# Altium integrated library WCAP-FTX2_rev15a.intlib: 100 symbols
Pins are listed as number, name and electrical type; pins without a type are passive.

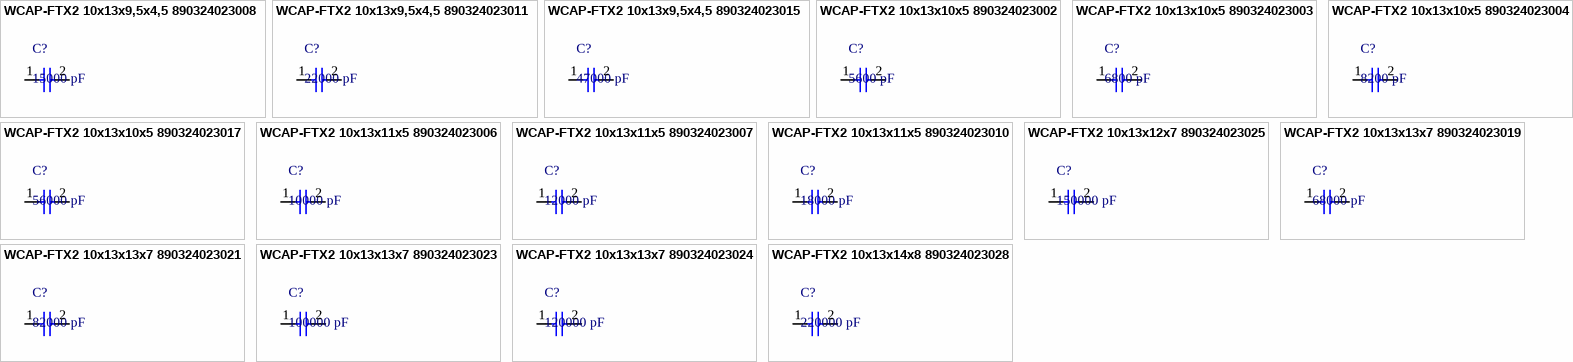
[diagram p0: symbols WCAP-FTX2 10x13x9,5x4,5 890324023008 to WCAP-FTX2 10x13x14x8 890324023028]

## WCAP-FTX2 10x13x9,5x4,5 890324023008
designator C?, comment 15000 pF
WCAP-FTX2 Film Capacitors, C=15000 pF; Manufacturer: Wurth Elektronik; partNo: 890324023008; E-mail: libraries@we-online.com; ComponentLink1Description: Manufacturer; ComponentLink1URL: http://www.we-online.com; ComponentLink2Description: Datasheet; ComponentLink2URL: http://katalog.we-online.de/pbs/datasheet/890324023008.pdf; Created by: Karrer Zheng; Created Date: 1/21/2015; Capacitance: 15000 pF
footprint WCAP-FTX2 10x13x9,5x4,5
pins: 1  , 2  

## WCAP-FTX2 10x13x9,5x4,5 890324023011
designator C?, comment 22000 pF
WCAP-FTX2 Film Capacitors, C=22000 pF; Manufacturer: Wurth Elektronik; partNo: 890324023011; E-mail: libraries@we-online.com; ComponentLink1Description: Manufacturer; ComponentLink1URL: http://www.we-online.com; ComponentLink2Description: Datasheet; ComponentLink2URL: http://katalog.we-online.de/pbs/datasheet/890324023011.pdf; Created by: Karrer Zheng; Created Date: 1/21/2015; Capacitance: 22000 pF
footprint WCAP-FTX2 10x13x9,5x4,5
pins: 1  , 2  

## WCAP-FTX2 10x13x9,5x4,5 890324023015
designator C?, comment 47000 pF
WCAP-FTX2 Film Capacitors, C=47000 pF; Manufacturer: Wurth Elektronik; partNo: 890324023015; E-mail: libraries@we-online.com; ComponentLink1Description: Manufacturer; ComponentLink1URL: http://www.we-online.com; ComponentLink2Description: Datasheet; ComponentLink2URL: http://katalog.we-online.de/pbs/datasheet/890324023015.pdf; Created by: Karrer Zheng; Created Date: 1/21/2015; Capacitance: 47000 pF
footprint WCAP-FTX2 10x13x9,5x4,5
pins: 1  , 2  

## WCAP-FTX2 10x13x10x5 890324023002
designator C?, comment 5600 pF
WCAP-FTX2 Film Capacitors, C=5600 pF; Manufacturer: Wurth Elektronik; partNo: 890324023002; E-mail: libraries@we-online.com; ComponentLink1Description: Manufacturer; ComponentLink1URL: http://www.we-online.com; ComponentLink2Description: Datasheet; ComponentLink2URL: http://katalog.we-online.de/pbs/datasheet/890324023002.pdf; Created by: Karrer Zheng; Created Date: 1/21/2015; Capacitance: 5600 pF
footprint WCAP-FTX2 10x13x10x5
pins: 1  , 2  

## WCAP-FTX2 10x13x10x5 890324023003
designator C?, comment 6800 pF
WCAP-FTX2 Film Capacitors, C=6800 pF; Manufacturer: Wurth Elektronik; partNo: 890324023003; E-mail: libraries@we-online.com; ComponentLink1Description: Manufacturer; ComponentLink1URL: http://www.we-online.com; ComponentLink2Description: Datasheet; ComponentLink2URL: http://katalog.we-online.de/pbs/datasheet/890324023003.pdf; Created by: Karrer Zheng; Created Date: 1/21/2015; Capacitance: 6800 pF
footprint WCAP-FTX2 10x13x10x5
pins: 1  , 2  

## WCAP-FTX2 10x13x10x5 890324023004
designator C?, comment 8200 pF
WCAP-FTX2 Film Capacitors, C=8200 pF; Manufacturer: Wurth Elektronik; partNo: 890324023004; E-mail: libraries@we-online.com; ComponentLink1Description: Manufacturer; ComponentLink1URL: http://www.we-online.com; ComponentLink2Description: Datasheet; ComponentLink2URL: http://katalog.we-online.de/pbs/datasheet/890324023004.pdf; Created by: Karrer Zheng; Created Date: 1/21/2015; Capacitance: 8200 pF
footprint WCAP-FTX2 10x13x10x5
pins: 1  , 2  

## WCAP-FTX2 10x13x10x5 890324023017
designator C?, comment 56000 pF
WCAP-FTX2 Film Capacitors, C=56000 pF; Manufacturer: Wurth Elektronik; partNo: 890324023017; E-mail: libraries@we-online.com; ComponentLink1Description: Manufacturer; ComponentLink1URL: http://www.we-online.com; ComponentLink2Description: Datasheet; ComponentLink2URL: http://katalog.we-online.de/pbs/datasheet/890324023017.pdf; Created by: Karrer Zheng; Created Date: 1/21/2015; Capacitance: 56000 pF
footprint WCAP-FTX2 10x13x10x5
pins: 1  , 2  

## WCAP-FTX2 10x13x11x5 890324023006
designator C?, comment 10000 pF
WCAP-FTX2 Film Capacitors, C=10000 pF; Manufacturer: Wurth Elektronik; partNo: 890324023006; E-mail: libraries@we-online.com; ComponentLink1Description: Manufacturer; ComponentLink1URL: http://www.we-online.com; ComponentLink2Description: Datasheet; ComponentLink2URL: http://katalog.we-online.de/pbs/datasheet/890324023006.pdf; Created by: Karrer Zheng; Created Date: 1/21/2015; Capacitance: 10000 pF
footprint WCAP-FTX2 10x13x11x5
pins: 1  , 2  

## WCAP-FTX2 10x13x11x5 890324023007
designator C?, comment 12000 pF
WCAP-FTX2 Film Capacitors, C=12000 pF; Manufacturer: Wurth Elektronik; partNo: 890324023007; E-mail: libraries@we-online.com; ComponentLink1Description: Manufacturer; ComponentLink1URL: http://www.we-online.com; ComponentLink2Description: Datasheet; ComponentLink2URL: http://katalog.we-online.de/pbs/datasheet/890324023007.pdf; Created by: Karrer Zheng; Created Date: 1/21/2015; Capacitance: 12000 pF
footprint WCAP-FTX2 10x13x11x5
pins: 1  , 2  

## WCAP-FTX2 10x13x11x5 890324023010
designator C?, comment 18000 pF
WCAP-FTX2 Film Capacitors, C=18000 pF; Manufacturer: Wurth Elektronik; partNo: 890324023010; E-mail: libraries@we-online.com; ComponentLink1Description: Manufacturer; ComponentLink1URL: http://www.we-online.com; ComponentLink2Description: Datasheet; ComponentLink2URL: http://katalog.we-online.de/pbs/datasheet/890324023010.pdf; Created by: Karrer Zheng; Created Date: 1/21/2015; Capacitance: 18000 pF
footprint WCAP-FTX2 10x13x11x5
pins: 1  , 2  

## WCAP-FTX2 10x13x12x7 890324023025
designator C?, comment 150000 pF
WCAP-FTX2 Film Capacitors, C=150000 pF; Manufacturer: Wurth Elektronik; partNo: 890324023025; E-mail: libraries@we-online.com; ComponentLink1Description: Manufacturer; ComponentLink1URL: http://www.we-online.com; ComponentLink2Description: Datasheet; ComponentLink2URL: http://katalog.we-online.de/pbs/datasheet/890324023025.pdf; Created by: Karrer Zheng; Created Date: 1/21/2015; Capacitance: 150000 pF
footprint WCAP-FTX2 10x13x12x7
pins: 1  , 2  

## WCAP-FTX2 10x13x13x7 890324023019
designator C?, comment 68000 pF
WCAP-FTX2 Film Capacitors, C=68000 pF; Manufacturer: Wurth Elektronik; partNo: 890324023019; E-mail: libraries@we-online.com; ComponentLink1Description: Manufacturer; ComponentLink1URL: http://www.we-online.com; ComponentLink2Description: Datasheet; ComponentLink2URL: http://katalog.we-online.de/pbs/datasheet/890324023019.pdf; Created by: Karrer Zheng; Created Date: 1/21/2015; Capacitance: 68000 pF
footprint WCAP-FTX2 10x13x13x7
pins: 1  , 2  

## WCAP-FTX2 10x13x13x7 890324023021
designator C?, comment 82000 pF
WCAP-FTX2 Film Capacitors, C=82000 pF; Manufacturer: Wurth Elektronik; partNo: 890324023021; E-mail: libraries@we-online.com; ComponentLink1Description: Manufacturer; ComponentLink1URL: http://www.we-online.com; ComponentLink2Description: Datasheet; ComponentLink2URL: http://katalog.we-online.de/pbs/datasheet/890324023021.pdf; Created by: Karrer Zheng; Created Date: 1/21/2015; Capacitance: 82000 pF
footprint WCAP-FTX2 10x13x13x7
pins: 1  , 2  

## WCAP-FTX2 10x13x13x7 890324023023
designator C?, comment 100000 pF
WCAP-FTX2 Film Capacitors, C=100000 pF; Manufacturer: Wurth Elektronik; partNo: 890324023023; E-mail: libraries@we-online.com; ComponentLink1Description: Manufacturer; ComponentLink1URL: http://www.we-online.com; ComponentLink2Description: Datasheet; ComponentLink2URL: http://katalog.we-online.de/pbs/datasheet/890324023023.pdf; Created by: Karrer Zheng; Created Date: 1/21/2015; Capacitance: 100000 pF
footprint WCAP-FTX2 10x13x13x7
pins: 1  , 2  

## WCAP-FTX2 10x13x13x7 890324023024
designator C?, comment 120000 pF
WCAP-FTX2 Film Capacitors, C=120000 pF; Manufacturer: Wurth Elektronik; partNo: 890324023024; E-mail: libraries@we-online.com; ComponentLink1Description: Manufacturer; ComponentLink1URL: http://www.we-online.com; ComponentLink2Description: Datasheet; ComponentLink2URL: http://katalog.we-online.de/pbs/datasheet/890324023024.pdf; Created by: Karrer Zheng; Created Date: 1/21/2015; Capacitance: 120000 pF
footprint WCAP-FTX2 10x13x13x7
pins: 1  , 2  

## WCAP-FTX2 10x13x14x8 890324023028
designator C?, comment 220000 pF
WCAP-FTX2 Film Capacitors, C=220000 pF; Manufacturer: Wurth Elektronik; partNo: 890324023028; E-mail: libraries@we-online.com; ComponentLink1Description: Manufacturer; ComponentLink1URL: http://www.we-online.com; ComponentLink2Description: Datasheet; ComponentLink2URL: http://katalog.we-online.de/pbs/datasheet/890324023028.pdf; Created by: Karrer Zheng; Created Date: 1/21/2015; Capacitance: 220000 pF
footprint WCAP-FTX2 10x13x14x8
pins: 1  , 2  


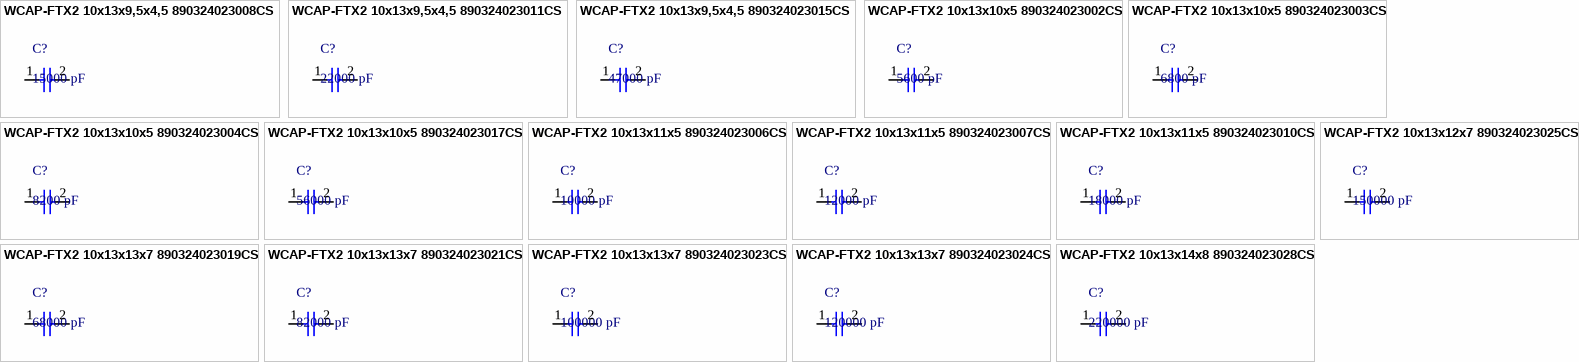
[diagram p1: symbols WCAP-FTX2 10x13x9,5x4,5 890324023008CS to WCAP-FTX2 10x13x14x8 890324023028CS]

## WCAP-FTX2 10x13x9,5x4,5 890324023008CS
designator C?, comment 15000 pF
WCAP-FTX2 Film Capacitors, C=15000 pF; Manufacturer: Wurth Elektronik; partNo: 890324023008CS; E-mail: libraries@we-online.com; ComponentLink1Description: Manufacturer; ComponentLink1URL: http://www.we-online.com; ComponentLink2Description: Datasheet; ComponentLink2URL: http://katalog.we-online.de/pbs/datasheet/890324023008CS.pdf; Created by: Karrer Zheng; Created Date: 1/21/2015; Capacitance: 15000 pF
footprint WCAP-FTX2 10x13x9,5x4,5x4
pins: 1  , 2  

## WCAP-FTX2 10x13x9,5x4,5 890324023011CS
designator C?, comment 22000 pF
WCAP-FTX2 Film Capacitors, C=22000 pF; Manufacturer: Wurth Elektronik; partNo: 890324023011CS; E-mail: libraries@we-online.com; ComponentLink1Description: Manufacturer; ComponentLink1URL: http://www.we-online.com; ComponentLink2Description: Datasheet; ComponentLink2URL: http://katalog.we-online.de/pbs/datasheet/890324023011CS.pdf; Created by: Karrer Zheng; Created Date: 1/21/2015; Capacitance: 22000 pF
footprint WCAP-FTX2 10x13x9,5x4,5x4
pins: 1  , 2  

## WCAP-FTX2 10x13x9,5x4,5 890324023015CS
designator C?, comment 47000 pF
WCAP-FTX2 Film Capacitors, C=47000 pF; Manufacturer: Wurth Elektronik; partNo: 890324023015CS; E-mail: libraries@we-online.com; ComponentLink1Description: Manufacturer; ComponentLink1URL: http://www.we-online.com; ComponentLink2Description: Datasheet; ComponentLink2URL: http://katalog.we-online.de/pbs/datasheet/890324023015CS.pdf; Created by: Karrer Zheng; Created Date: 1/21/2015; Capacitance: 47000 pF
footprint WCAP-FTX2 10x13x9,5x4,5x4
pins: 1  , 2  

## WCAP-FTX2 10x13x10x5 890324023002CS
designator C?, comment 5600 pF
WCAP-FTX2 Film Capacitors, C=5600 pF; Manufacturer: Wurth Elektronik; partNo: 890324023002CS; E-mail: libraries@we-online.com; ComponentLink1Description: Manufacturer; ComponentLink1URL: http://www.we-online.com; ComponentLink2Description: Datasheet; ComponentLink2URL: http://katalog.we-online.de/pbs/datasheet/890324023002CS.pdf; Created by: Karrer Zheng; Created Date: 1/21/2015; Capacitance: 5600 pF
footprint WCAP-FTX2 10x13x10x5x4
pins: 1  , 2  

## WCAP-FTX2 10x13x10x5 890324023003CS
designator C?, comment 6800 pF
WCAP-FTX2 Film Capacitors, C=6800 pF; Manufacturer: Wurth Elektronik; partNo: 890324023003CS; E-mail: libraries@we-online.com; ComponentLink1Description: Manufacturer; ComponentLink1URL: http://www.we-online.com; ComponentLink2Description: Datasheet; ComponentLink2URL: http://katalog.we-online.de/pbs/datasheet/890324023003CS.pdf; Created by: Karrer Zheng; Created Date: 1/21/2015; Capacitance: 6800 pF
footprint WCAP-FTX2 10x13x10x5x4
pins: 1  , 2  

## WCAP-FTX2 10x13x10x5 890324023004CS
designator C?, comment 8200 pF
WCAP-FTX2 Film Capacitors, C=8200 pF; Manufacturer: Wurth Elektronik; partNo: 890324023004CS; E-mail: libraries@we-online.com; ComponentLink1Description: Manufacturer; ComponentLink1URL: http://www.we-online.com; ComponentLink2Description: Datasheet; ComponentLink2URL: http://katalog.we-online.de/pbs/datasheet/890324023004CS.pdf; Created by: Karrer Zheng; Created Date: 1/21/2015; Capacitance: 8200 pF
footprint WCAP-FTX2 10x13x10x5x4
pins: 1  , 2  

## WCAP-FTX2 10x13x10x5 890324023017CS
designator C?, comment 56000 pF
WCAP-FTX2 Film Capacitors, C=56000 pF; Manufacturer: Wurth Elektronik; partNo: 890324023017CS; E-mail: libraries@we-online.com; ComponentLink1Description: Manufacturer; ComponentLink1URL: http://www.we-online.com; ComponentLink2Description: Datasheet; ComponentLink2URL: http://katalog.we-online.de/pbs/datasheet/890324023017CS.pdf; Created by: Karrer Zheng; Created Date: 1/21/2015; Capacitance: 56000 pF
footprint WCAP-FTX2 10x13x10x5x4
pins: 1  , 2  

## WCAP-FTX2 10x13x11x5 890324023006CS
designator C?, comment 10000 pF
WCAP-FTX2 Film Capacitors, C=10000 pF; Manufacturer: Wurth Elektronik; partNo: 890324023006CS; E-mail: libraries@we-online.com; ComponentLink1Description: Manufacturer; ComponentLink1URL: http://www.we-online.com; ComponentLink2Description: Datasheet; ComponentLink2URL: http://katalog.we-online.de/pbs/datasheet/890324023006CS.pdf; Created by: Karrer Zheng; Created Date: 1/21/2015; Capacitance: 10000 pF
footprint WCAP-FTX2 10x13x11x5x4
pins: 1  , 2  

## WCAP-FTX2 10x13x11x5 890324023007CS
designator C?, comment 12000 pF
WCAP-FTX2 Film Capacitors, C=12000 pF; Manufacturer: Wurth Elektronik; partNo: 890324023007CS; E-mail: libraries@we-online.com; ComponentLink1Description: Manufacturer; ComponentLink1URL: http://www.we-online.com; ComponentLink2Description: Datasheet; ComponentLink2URL: http://katalog.we-online.de/pbs/datasheet/890324023007CS.pdf; Created by: Karrer Zheng; Created Date: 1/21/2015; Capacitance: 12000 pF
footprint WCAP-FTX2 10x13x11x5x4
pins: 1  , 2  

## WCAP-FTX2 10x13x11x5 890324023010CS
designator C?, comment 18000 pF
WCAP-FTX2 Film Capacitors, C=18000 pF; Manufacturer: Wurth Elektronik; partNo: 890324023010CS; E-mail: libraries@we-online.com; ComponentLink1Description: Manufacturer; ComponentLink1URL: http://www.we-online.com; ComponentLink2Description: Datasheet; ComponentLink2URL: http://katalog.we-online.de/pbs/datasheet/890324023010CS.pdf; Created by: Karrer Zheng; Created Date: 1/21/2015; Capacitance: 18000 pF
footprint WCAP-FTX2 10x13x11x5x4
pins: 1  , 2  

## WCAP-FTX2 10x13x12x7 890324023025CS
designator C?, comment 150000 pF
WCAP-FTX2 Film Capacitors, C=150000 pF; Manufacturer: Wurth Elektronik; partNo: 890324023025CS; E-mail: libraries@we-online.com; ComponentLink1Description: Manufacturer; ComponentLink1URL: http://www.we-online.com; ComponentLink2Description: Datasheet; ComponentLink2URL: http://katalog.we-online.de/pbs/datasheet/890324023025CS.pdf; Created by: Karrer Zheng; Created Date: 1/21/2015; Capacitance: 150000 pF
footprint WCAP-FTX2 10x13x12x7x4
pins: 1  , 2  

## WCAP-FTX2 10x13x13x7 890324023019CS
designator C?, comment 68000 pF
WCAP-FTX2 Film Capacitors, C=68000 pF; Manufacturer: Wurth Elektronik; partNo: 890324023019CS; E-mail: libraries@we-online.com; ComponentLink1Description: Manufacturer; ComponentLink1URL: http://www.we-online.com; ComponentLink2Description: Datasheet; ComponentLink2URL: http://katalog.we-online.de/pbs/datasheet/890324023019CS.pdf; Created by: Karrer Zheng; Created Date: 1/21/2015; Capacitance: 68000 pF
footprint WCAP-FTX2 10x13x13x7x4
pins: 1  , 2  

## WCAP-FTX2 10x13x13x7 890324023021CS
designator C?, comment 82000 pF
WCAP-FTX2 Film Capacitors, C=82000 pF; Manufacturer: Wurth Elektronik; partNo: 890324023021CS; E-mail: libraries@we-online.com; ComponentLink1Description: Manufacturer; ComponentLink1URL: http://www.we-online.com; ComponentLink2Description: Datasheet; ComponentLink2URL: http://katalog.we-online.de/pbs/datasheet/890324023021CS.pdf; Created by: Karrer Zheng; Created Date: 1/21/2015; Capacitance: 82000 pF
footprint WCAP-FTX2 10x13x13x7x4
pins: 1  , 2  

## WCAP-FTX2 10x13x13x7 890324023023CS
designator C?, comment 100000 pF
WCAP-FTX2 Film Capacitors, C=100000 pF; Manufacturer: Wurth Elektronik; partNo: 890324023023CS; E-mail: libraries@we-online.com; ComponentLink1Description: Manufacturer; ComponentLink1URL: http://www.we-online.com; ComponentLink2Description: Datasheet; ComponentLink2URL: http://katalog.we-online.de/pbs/datasheet/890324023023CS.pdf; Created by: Karrer Zheng; Created Date: 1/21/2015; Capacitance: 100000 pF
footprint WCAP-FTX2 10x13x13x7x4
pins: 1  , 2  

## WCAP-FTX2 10x13x13x7 890324023024CS
designator C?, comment 120000 pF
WCAP-FTX2 Film Capacitors, C=120000 pF; Manufacturer: Wurth Elektronik; partNo: 890324023024CS; E-mail: libraries@we-online.com; ComponentLink1Description: Manufacturer; ComponentLink1URL: http://www.we-online.com; ComponentLink2Description: Datasheet; ComponentLink2URL: http://katalog.we-online.de/pbs/datasheet/890324023024CS.pdf; Created by: Karrer Zheng; Created Date: 1/21/2015; Capacitance: 120000 pF
footprint WCAP-FTX2 10x13x13x7x4
pins: 1  , 2  

## WCAP-FTX2 10x13x14x8 890324023028CS
designator C?, comment 220000 pF
WCAP-FTX2 Film Capacitors, C=220000 pF; Manufacturer: Wurth Elektronik; partNo: 890324023028CS; E-mail: libraries@we-online.com; ComponentLink1Description: Manufacturer; ComponentLink1URL: http://www.we-online.com; ComponentLink2Description: Datasheet; ComponentLink2URL: http://katalog.we-online.de/pbs/datasheet/890324023028CS.pdf; Created by: Karrer Zheng; Created Date: 1/21/2015; Capacitance: 220000 pF
footprint WCAP-FTX2 10x13x14x8x4
pins: 1  , 2  


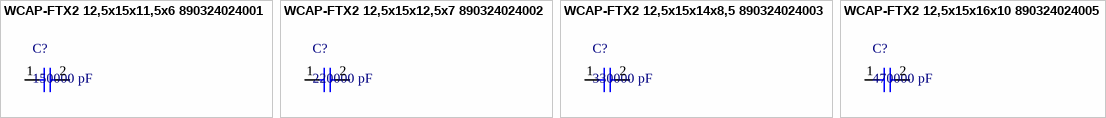
[diagram p2: symbols WCAP-FTX2 12,5x15x11,5x6 890324024001 to WCAP-FTX2 12,5x15x16x10 890324024005]

## WCAP-FTX2 12,5x15x11,5x6 890324024001
designator C?, comment 150000 pF
WCAP-FTX2 Film Capacitors, C=150000 pF; Manufacturer: Wurth Elektronik; partNo: 890324024001; E-mail: libraries@we-online.com; ComponentLink1Description: Manufacturer; ComponentLink1URL: http://www.we-online.com; ComponentLink2Description: Datasheet; ComponentLink2URL: http://katalog.we-online.de/pbs/datasheet/890324024001.pdf; Created by: Karrer Zheng; Created Date: 1/26/2015; Capacitance: 150000 pF
footprint WCAP-FTX2 12,5x15x11,5x6
pins: 1  , 2  

## WCAP-FTX2 12,5x15x12,5x7 890324024002
designator C?, comment 220000 pF
WCAP-FTX2 Film Capacitors, C=220000 pF; Manufacturer: Wurth Elektronik; partNo: 890324024002; E-mail: libraries@we-online.com; ComponentLink1Description: Manufacturer; ComponentLink1URL: http://www.we-online.com; ComponentLink2Description: Datasheet; ComponentLink2URL: http://katalog.we-online.de/pbs/datasheet/890324024002.pdf; Created by: Karrer Zheng; Created Date: 1/26/2015; Capacitance: 220000 pF
footprint WCAP-FTX2 12,5x15x12,5x7
pins: 1  , 2  

## WCAP-FTX2 12,5x15x14x8,5 890324024003
designator C?, comment 330000 pF
WCAP-FTX2 Film Capacitors, C=330000 pF; Manufacturer: Wurth Elektronik; partNo: 890324024003; E-mail: libraries@we-online.com; ComponentLink1Description: Manufacturer; ComponentLink1URL: http://www.we-online.com; ComponentLink2Description: Datasheet; ComponentLink2URL: http://katalog.we-online.de/pbs/datasheet/890324024003.pdf; Created by: Karrer Zheng; Created Date: 1/26/2015; Capacitance: 330000 pF
footprint WCAP-FTX2 12,5x15x14x8,5
pins: 1  , 2  

## WCAP-FTX2 12,5x15x16x10 890324024005
designator C?, comment 470000 pF
WCAP-FTX2 Film Capacitors, C=470000 pF; Manufacturer: Wurth Elektronik; partNo: 890324024005; E-mail: libraries@we-online.com; ComponentLink1Description: Manufacturer; ComponentLink1URL: http://www.we-online.com; ComponentLink2Description: Datasheet; ComponentLink2URL: http://katalog.we-online.de/pbs/datasheet/890324024005.pdf; Created by: Karrer Zheng; Created Date: 1/26/2015; Capacitance: 470000 pF
footprint WCAP-FTX2 12,5x15x16x10
pins: 1  , 2  


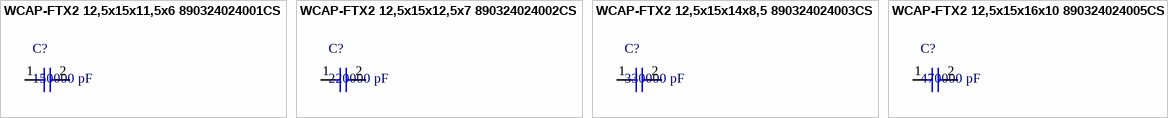
[diagram p3: symbols WCAP-FTX2 12,5x15x11,5x6 890324024001CS to WCAP-FTX2 12,5x15x16x10 890324024005CS]

## WCAP-FTX2 12,5x15x11,5x6 890324024001CS
designator C?, comment 150000 pF
WCAP-FTX2 Film Capacitors, C=150000 pF; Manufacturer: Wurth Elektronik; partNo: 890324024001CS; E-mail: libraries@we-online.com; ComponentLink1Description: Manufacturer; ComponentLink1URL: http://www.we-online.com; ComponentLink2Description: Datasheet; ComponentLink2URL: http://katalog.we-online.de/pbs/datasheet/890324024001CS.pdf; Created by: Karrer Zheng; Created Date: 1/21/2015; Capacitance: 150000 pF
footprint WCAP-FTX2 12,5x15x11,5x6x4
pins: 1  , 2  

## WCAP-FTX2 12,5x15x12,5x7 890324024002CS
designator C?, comment 220000 pF
WCAP-FTX2 Film Capacitors, C=220000 pF; Manufacturer: Wurth Elektronik; partNo: 890324024002CS; E-mail: libraries@we-online.com; ComponentLink1Description: Manufacturer; ComponentLink1URL: http://www.we-online.com; ComponentLink2Description: Datasheet; ComponentLink2URL: http://katalog.we-online.de/pbs/datasheet/890324024002CS.pdf; Created by: Karrer Zheng; Created Date: 1/21/2015; Capacitance: 220000 pF
footprint WCAP-FTX2 12,5x15x12,5x7x4
pins: 1  , 2  

## WCAP-FTX2 12,5x15x14x8,5 890324024003CS
designator C?, comment 330000 pF
WCAP-FTX2 Film Capacitors, C=330000 pF; Manufacturer: Wurth Elektronik; partNo: 890324024003CS; E-mail: libraries@we-online.com; ComponentLink1Description: Manufacturer; ComponentLink1URL: http://www.we-online.com; ComponentLink2Description: Datasheet; ComponentLink2URL: http://katalog.we-online.de/pbs/datasheet/890324024003CS.pdf; Created by: Karrer Zheng; Created Date: 1/21/2015; Capacitance: 330000 pF
footprint WCAP-FTX2 12,5x15x14x8,5x4
pins: 1  , 2  

## WCAP-FTX2 12,5x15x16x10 890324024005CS
designator C?, comment 470000 pF
WCAP-FTX2 Film Capacitors, C=470000 pF; Manufacturer: Wurth Elektronik; partNo: 890324024005CS; E-mail: libraries@we-online.com; ComponentLink1Description: Manufacturer; ComponentLink1URL: http://www.we-online.com; ComponentLink2Description: Datasheet; ComponentLink2URL: http://katalog.we-online.de/pbs/datasheet/890324024005CS.pdf; Created by: Karrer Zheng; Created Date: 1/21/2015; Capacitance: 470000 pF
footprint WCAP-FTX2 12,5x15x16x10x4
pins: 1  , 2  


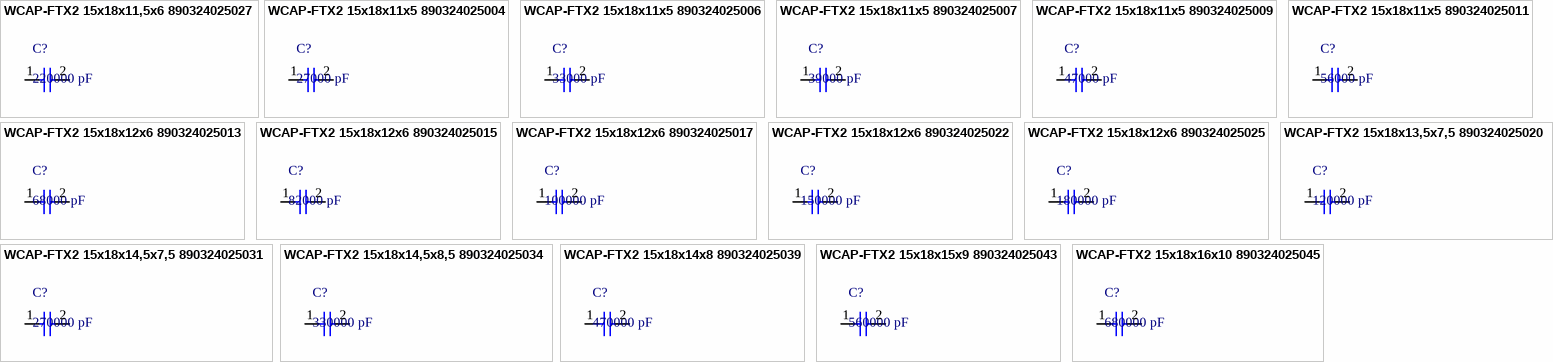
[diagram p4: symbols WCAP-FTX2 15x18x11,5x6 890324025027 to WCAP-FTX2 15x18x16x10 890324025045]

## WCAP-FTX2 15x18x11,5x6 890324025027
designator C?, comment 220000 pF
WCAP-FTX2 Film Capacitors, C=220000 pF; Manufacturer: Wurth Elektronik; partNo: 890324025027; E-mail: libraries@we-online.com; ComponentLink1Description: Manufacturer; ComponentLink1URL: http://www.we-online.com; ComponentLink2Description: Datasheet; ComponentLink2URL: http://katalog.we-online.de/pbs/datasheet/890324025027.pdf; Created by: Karrer Zheng; Created Date: 1/26/2015; Capacitance: 220000 pF
footprint WCAP-FTX2 15x18x11,5x6
pins: 1  , 2  

## WCAP-FTX2 15x18x11x5 890324025004
designator C?, comment 27000 pF
WCAP-FTX2 Film Capacitors, C=27000 pF; Manufacturer: Wurth Elektronik; partNo: 890324025004; E-mail: libraries@we-online.com; ComponentLink1Description: Manufacturer; ComponentLink1URL: http://www.we-online.com; ComponentLink2Description: Datasheet; ComponentLink2URL: http://katalog.we-online.de/pbs/datasheet/890324025004.pdf; Created by: Karrer Zheng; Created Date: 1/26/2015; Capacitance: 27000 pF
footprint WCAP-FTX2 15x18x11x5
pins: 1  , 2  

## WCAP-FTX2 15x18x11x5 890324025006
designator C?, comment 33000 pF
WCAP-FTX2 Film Capacitors, C=33000 pF; Manufacturer: Wurth Elektronik; partNo: 890324025006; E-mail: libraries@we-online.com; ComponentLink1Description: Manufacturer; ComponentLink1URL: http://www.we-online.com; ComponentLink2Description: Datasheet; ComponentLink2URL: http://katalog.we-online.de/pbs/datasheet/890324025006.pdf; Created by: Karrer Zheng; Created Date: 1/26/2015; Capacitance: 33000 pF
footprint WCAP-FTX2 15x18x11x5
pins: 1  , 2  

## WCAP-FTX2 15x18x11x5 890324025007
designator C?, comment 39000 pF
WCAP-FTX2 Film Capacitors, C=39000 pF; Manufacturer: Wurth Elektronik; partNo: 890324025007; E-mail: libraries@we-online.com; ComponentLink1Description: Manufacturer; ComponentLink1URL: http://www.we-online.com; ComponentLink2Description: Datasheet; ComponentLink2URL: http://katalog.we-online.de/pbs/datasheet/890324025007.pdf; Created by: Karrer Zheng; Created Date: 1/26/2015; Capacitance: 39000 pF
footprint WCAP-FTX2 15x18x11x5
pins: 1  , 2  

## WCAP-FTX2 15x18x11x5 890324025009
designator C?, comment 47000 pF
WCAP-FTX2 Film Capacitors, C=47000 pF; Manufacturer: Wurth Elektronik; partNo: 890324025009; E-mail: libraries@we-online.com; ComponentLink1Description: Manufacturer; ComponentLink1URL: http://www.we-online.com; ComponentLink2Description: Datasheet; ComponentLink2URL: http://katalog.we-online.de/pbs/datasheet/890324025009.pdf; Created by: Karrer Zheng; Created Date: 1/26/2015; Capacitance: 47000 pF
footprint WCAP-FTX2 15x18x11x5
pins: 1  , 2  

## WCAP-FTX2 15x18x11x5 890324025011
designator C?, comment 56000 pF
WCAP-FTX2 Film Capacitors, C=56000 pF; Manufacturer: Wurth Elektronik; partNo: 890324025011; E-mail: libraries@we-online.com; ComponentLink1Description: Manufacturer; ComponentLink1URL: http://www.we-online.com; ComponentLink2Description: Datasheet; ComponentLink2URL: http://katalog.we-online.de/pbs/datasheet/890324025011.pdf; Created by: Karrer Zheng; Created Date: 1/26/2015; Capacitance: 56000 pF
footprint WCAP-FTX2 15x18x11x5
pins: 1  , 2  

## WCAP-FTX2 15x18x12x6 890324025013
designator C?, comment 68000 pF
WCAP-FTX2 Film Capacitors, C=68000 pF; Manufacturer: Wurth Elektronik; partNo: 890324025013; E-mail: libraries@we-online.com; ComponentLink1Description: Manufacturer; ComponentLink1URL: http://www.we-online.com; ComponentLink2Description: Datasheet; ComponentLink2URL: http://katalog.we-online.de/pbs/datasheet/890324025013.pdf; Created by: Karrer Zheng; Created Date: 1/26/2015; Capacitance: 68000 pF
footprint WCAP-FTX2 15x18x12x6
pins: 1  , 2  

## WCAP-FTX2 15x18x12x6 890324025015
designator C?, comment 82000 pF
WCAP-FTX2 Film Capacitors, C=82000 pF; Manufacturer: Wurth Elektronik; partNo: 890324025015; E-mail: libraries@we-online.com; ComponentLink1Description: Manufacturer; ComponentLink1URL: http://www.we-online.com; ComponentLink2Description: Datasheet; ComponentLink2URL: http://katalog.we-online.de/pbs/datasheet/890324025015.pdf; Created by: Karrer Zheng; Created Date: 1/26/2015; Capacitance: 82000 pF
footprint WCAP-FTX2 15x18x12x6
pins: 1  , 2  

## WCAP-FTX2 15x18x12x6 890324025017
designator C?, comment 100000 pF
WCAP-FTX2 Film Capacitors, C=100000 pF; Manufacturer: Wurth Elektronik; partNo: 890324025017; E-mail: libraries@we-online.com; ComponentLink1Description: Manufacturer; ComponentLink1URL: http://www.we-online.com; ComponentLink2Description: Datasheet; ComponentLink2URL: http://katalog.we-online.de/pbs/datasheet/890324025017.pdf; Created by: Karrer Zheng; Created Date: 1/26/2015; Capacitance: 100000 pF
footprint WCAP-FTX2 15x18x12x6
pins: 1  , 2  
